# Altium footprint library PcbLibUltimate (1).pcblib: 202 footprints (part 13 of 13)
Each footprint in its own frame and in the unit in brackets; x right, y up, seen from the top. Pads: shape width x height; smd on the part's side, far side on the other; paste and mask are expansions set on the pad; w line width, h text height; cw(c..) or ccw(c..) is an arc to the next point about the centre after c.
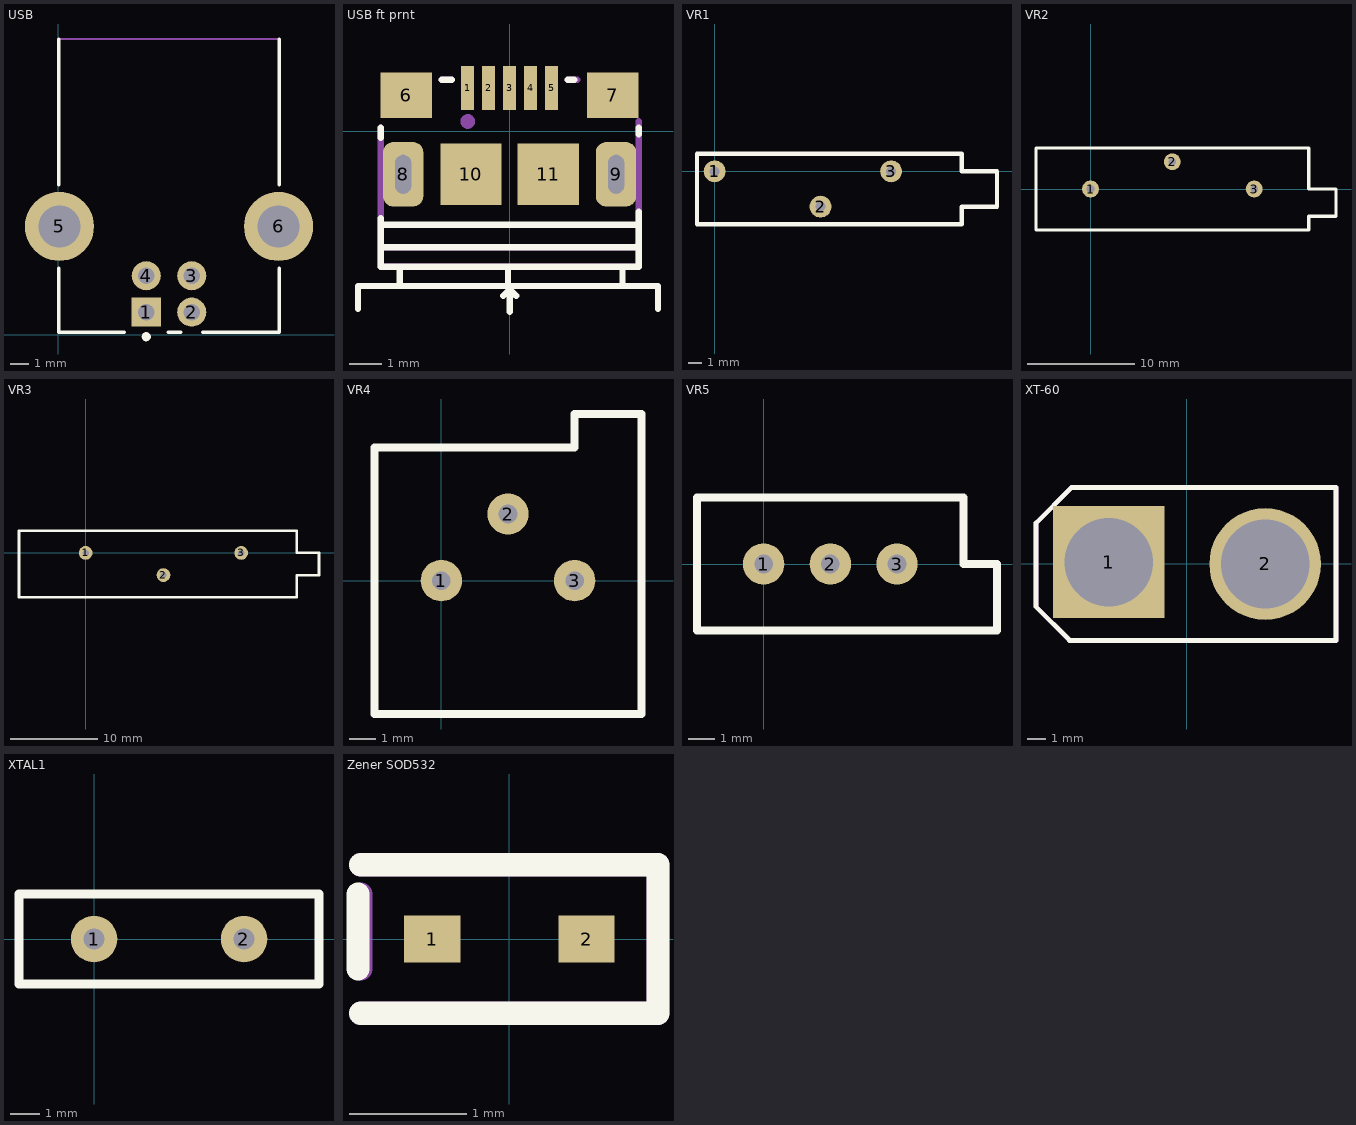
[diagram p12: the footprints below, top view; thin cyan lines are the x and y axes]

## USB [mm] "Connector; USB1.1, Type B, Thru-Hole; 4 Position; Right Angle"
height 10.95
pads (6):
  rect 1.6x1.6 hole 0.92: 1(4.846,1.246)
  round 1.6 hole 0.92: 2(7.346,1.246) 3(7.346,3.246) 4(4.846,3.246)
  round 3.8 hole 2.3: 5(0.076,5.956) 6(12.116,5.956)
Top Overlay:
  circle w0.25: c4.846,-0.104 r0.125
  lines w0.2: 0.046,3.656 0.046,0.136 3.646,0.136 ; 0.046,8.256 0.046,16.236 ; 6.046,0.136 6.746,0.136 ; 7.946,0.136 12.146,0.136 12.146,3.656 ; 12.146,8.256 12.146,16.236
Mechanical 1:
  lines w0.1: 0.046,16.256 12.146,16.256

## USB ft prnt [mm]
pads (11):
  rect 0.4x1.35 smd mask+0.05: 1(-1.3,1.338) 2(-0.65,1.338) 3(0,1.338) 4(0.65,1.338) 5(1.3,1.338)
  rect 1.6x1.4 smd: 6(-3.2,1.112) 7(3.2,1.112)
  rrect50% 1.25x2 hole 0.5 slot 1.2 at 90 deg: 8(-3.3,-1.338) 9(3.3,-1.338)
  rect 1.9x1.9 smd: 10(-1.2,-1.338) 11(1.2,-1.338)
Top Overlay:
  lines w0.2: -4.7,-5.5 -4.7,-4.8 -3.4,-4.8 ; -4,-2.7 -4,-3.8 -4,-4.2 3.9,-4.2 ; -4,-0.2 -4,0.1 ; -3.9,-4.2 3.9,-4.2 ; -3.9,-3.6 4,-3.6 ; -3.9,-2.9 4,-2.9 ; -2.1,1.6 -1.8,1.6 ; -0.05,-4.7 -0.05,-4.2 ; 0,-5.6 0,-4.9 ; 0.2,-5.1 0,-4.9 ; 1.8,1.6 2,1.6 ; 3.5,-4.3 3.5,-4.8 ; 4,-2.5 4,-3.6 ; 4,-0.1 4,0.1 ; 4.6,-5.5 4.6,-4.8 3.5,-4.8 ; -3.4,-4.8 3.5,-4.8 ; -3.4,-4.8 -3.4,-4.2 -3.4,-4.8 ; 0,-4.9 -0.2,-5.1 0,-4.9 ; 3.9,-4.2 4,-4.2 4,-3.6
Mechanical 29:
  circle w0.254: c-1.3,0.3 r0.1
  lines w0.2: -4,-3.6 3.9,-3.6 4,-3.5 ; -4,0.1 -4,-4.2 4,-4.2 4,0.3 ; -2.1,1.6 -1.8,1.6 ; 1.8,1.6 2.1,1.6
  text "'.Designator'" at -3.5,-2.1 h1.52
3D body "10118193-0001lfc.stp": height 2.88, standoff -0.72, extent -3.928,-4.16 3.929,1.5

## VR1 [mil]
pads (3):
  round 62 hole 28: 1(0,0) 2(300,-100) 3(500,0)
Top Overlay:
  lines w12: -50,-150 700,-150 700,-100 800,-100 800,0 700,0 700,50 -50,50 -50,-150

## VR2 [mil]
pads (3):
  round 62 hole 28: 1(0,0) 2(300,100) 3(600,0)
Top Overlay:
  lines w12: -200,-150 -200,150 800,150 800,0 900,0 900,-100 800,-100 800,-150 -200,-150

## VR3 [mil]
pads (3):
  round 62 hole 28: 1(0,0) 2(350,-100) 3(700,0)
Top Overlay:
  lines w12: -300,-200 950,-200 950,-100 1050,-100 1050,0 950,0 950,100 -300,100 -300,-200

## VR4 [mil]
pads (3):
  round 62 hole 28: 1(0,0) 2(100,100) 3(200,0)
Top Overlay:
  lines w12: -100,-200 300,-200 300,250 200,250 200,200 -100,200 -100,-200

## VR5 [mil]
pads (3):
  round 62 hole 28: 1(0,0) 2(100,0) 3(200,0)
Top Overlay:
  lines w12: -100,-100 -100,100 300,100 300,0 350,0 350,-100 -100,-100

## XT-60 [mm]
pads (2):
  rect 6x6 hole 4.75: 1(-4.2,0.1)
  round 6 hole 4.75: 2(4.2,0)
Top Overlay:
  lines w0.254: -6.3,-4.1 8,-4.1 8,4.1 -6.2,4.1 ; -6.3,-4.1 -6.3,-4.1 ; -6.3,-4.1 -8.1,-2.3 -8.1,-1.5 -8.1,1.4 -8.1,2.2 -6.2,4.1 ; -6.2,4.1 -6.2,4.1
Mechanical 2:
  lines w0.254: -8.1,-2.3 -8.1,2.2 -6.2,4.1 8,4.1 8,-4.1 -6.3,-4.1 -8.1,-2.3
  text ".Designator" at -1.9,-0.7 h2
3D body "User Library-XT60 female.step": height 19.21, standoff -2.99, extent -7.9,-3.975 8,4.175

## XTAL1 [mil]
pads (2):
  round 62 hole 28: 1(0,0) 2(200,0)
Top Overlay:
  lines w12: -100,-60 -100,60 300,60 300,-60 -100,-60

## Zener SOD532 [mm]
pads (2):
  rect 0.48x0.4 smd: 1(-0.66,0) 2(0.66,0)
Top Overlay:
  lines w0.2: -1.295,-0.254 -1.295,0.381 ; -1.27,-0.635 1.27,-0.635 1.27,0.635 -1.27,0.635
Mechanical 2:
  lines w0.2: -1.27,-0.635 1.27,-0.635 1.27,0.635 -1.27,0.635 ; -1.27,-0.254 -1.27,0.381
  text "'.Designator" at 0.762,-1.524 h1.52
3D body "MM5Z5V1T1G.stp": height 0.7, standoff 0, extent -0.8,-0.4 0.8,0.4